# Altium footprint library Tomra_Cadstar_Footprints.PcbLib: 380 footprints (part 11 of 24)
Each footprint in its own frame and in the unit in brackets; x right, y up, seen from the top. Pads: shape width x height; smd on the part's side, far side on the other; paste and mask are expansions set on the pad; w line width, h text height; cw(c..) or ccw(c..) is an arc to the next point about the centre after c.
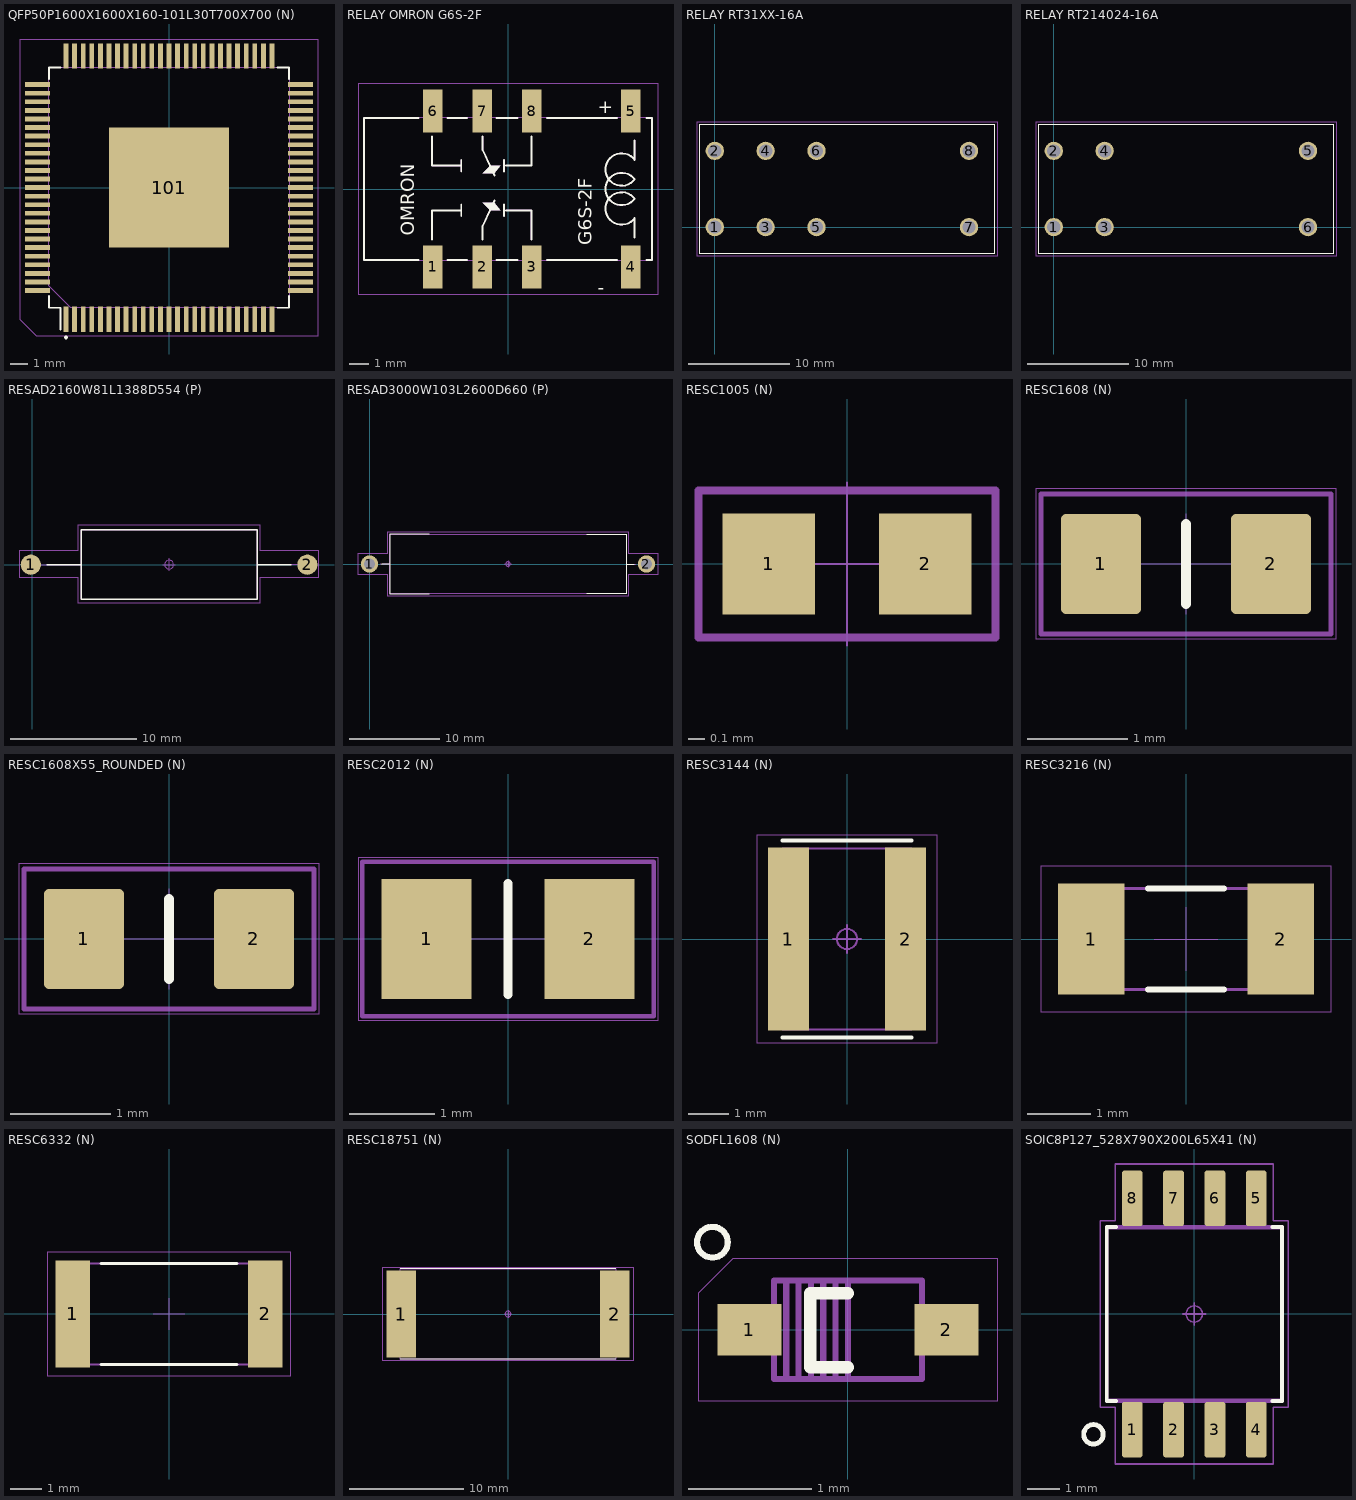
[diagram p10: the footprints below, top view; thin cyan lines are the x and y axes]

## QFP50P1600X1600X160-101L30T700X700 (N) [mm]
height 1.6
pads (101):
  rect 0.28x1.47 smd paste+0 mask+0: 1(-6,-7.67) 2(-5.5,-7.67) 3(-5,-7.67) 4(-4.5,-7.67) 5(-4,-7.67) 6(-3.5,-7.67) 7(-3,-7.67) 8(-2.5,-7.67) 9(-2,-7.67) 10(-1.5,-7.67) 11(-1,-7.67) 12(-0.5,-7.67) 13(0,-7.67) 14(0.5,-7.67) 15(1,-7.67) 16(1.5,-7.67) 17(2,-7.67) 18(2.5,-7.67) 19(3,-7.67) 20(3.5,-7.67) 21(4,-7.67) 22(4.5,-7.67) 23(5,-7.67) 24(5.5,-7.67) 25(6,-7.67) 51(6,7.67) 52(5.5,7.67) 53(5,7.67) 54(4.5,7.67) 55(4,7.67) 56(3.5,7.67) 57(3,7.67) 58(2.5,7.67) 59(2,7.67) 60(1.5,7.67) 61(1,7.67) 62(0.5,7.67) 63(0,7.67) 64(-0.5,7.67) 65(-1,7.67) 66(-1.5,7.67) 67(-2,7.67) 68(-2.5,7.67) 69(-3,7.67) 70(-3.5,7.67) 71(-4,7.67) 72(-4.5,7.67) 73(-5,7.67) 74(-5.5,7.67) 75(-6,7.67)
  rect 1.47x0.28 smd paste+0 mask+0: 26(7.67,-6) 27(7.67,-5.5) 28(7.67,-5) 29(7.67,-4.5) 30(7.67,-4) 31(7.67,-3.5) 32(7.67,-3) 33(7.67,-2.5) 34(7.67,-2) 35(7.67,-1.5) 36(7.67,-1) 37(7.67,-0.5) 38(7.67,0) 39(7.67,0.5) 40(7.67,1) 41(7.67,1.5) 42(7.67,2) 43(7.67,2.5) 44(7.67,3) 45(7.67,3.5) 46(7.67,4) 47(7.67,4.5) 48(7.67,5) 49(7.67,5.5) 50(7.67,6) 76(-7.67,6) 77(-7.67,5.5) 78(-7.67,5) 79(-7.67,4.5) 80(-7.67,4) 81(-7.67,3.5) 82(-7.67,3) 83(-7.67,2.5) 84(-7.67,2) 85(-7.67,1.5) 86(-7.67,1) 87(-7.67,0.5) 88(-7.67,0) 89(-7.67,-0.5) 90(-7.67,-1) 91(-7.67,-1.5) 92(-7.67,-2) 93(-7.67,-2.5) 94(-7.67,-3) 95(-7.67,-3.5) 96(-7.67,-4) 97(-7.67,-4.5) 98(-7.67,-5) 99(-7.67,-5.5) 100(-7.67,-6)
  rect 7x7 smd paste+0 mask+0: 101(0,0)
Top Silk:
  region: -6.1,-8.725 -6.1,-8.684 -6.041,-8.625 -5.959,-8.625 -5.9,-8.684 -5.9,-8.725 -5.9,-8.766 -5.959,-8.825 -6.041,-8.825 -6.1,-8.766
  lines w0.1: -7,-6.32 -7,-7 -6.32,-7 -6.32,-8.285 ; -7,6.32 -7,7 -6.32,7 ; 6.32,-7 7,-7 7,-6.32 ; 6.32,7 7,7 7,6.32
  text ".Designator" at -3.599,-0.35 h0.7
Top Paste:
  region: 3.155,-3.155 1.505,-3.155 1.505,-1.505 3.155,-1.505
  region: 3.155,-0.825 1.505,-0.825 1.505,0.825 3.155,0.825
  region: 3.155,1.505 1.505,1.505 1.505,3.155 3.155,3.155
  region: 0.825,-3.155 -0.825,-3.155 -0.825,-1.505 0.825,-1.505
  region: 0.825,-0.825 -0.825,-0.825 -0.825,0.825 0.825,0.825
  region: 0.825,1.505 -0.825,1.505 -0.825,3.155 0.825,3.155
  region: -1.505,-3.155 -3.155,-3.155 -3.155,-1.505 -1.505,-1.505
  region: -1.505,-0.825 -3.155,-0.825 -3.155,0.825 -1.505,0.825
  region: -1.505,1.505 -3.155,1.505 -3.155,3.155 -1.505,3.155
Top Assembly:
  lines w0.05: -7,-5.73 -5.73,-7 7,-7 7,7 -7,7 -7,-5.73
Top Placement:
  lines w0.01: -8.66,-7.7 -7.7,-8.66 8.66,-8.66 8.66,8.66 -8.66,8.66 -8.66,-7.7
  lines w0.05: -0.35,0 0.35,0 ; 0,-0.35 0,0.35 ; -0.25,0 cw(c0,0) 0.25,0 cw(c0,0) -0.25,0

## RELAY OMRON G6S-2F [mm]
height 7
pads (8):
  rect 1x2.2 smd paste+0 mask+0: 1(-3.86,-4) 2(-1.32,-4) 3(1.22,-4) 4(6.3,-4) 5(6.3,4) 6(-3.86,4) 7(-1.32,4) 8(1.22,4)
Top Silk:
  region: -0.4,-1.1 -0.9,-1.1 -1.3,-0.7 -0.7,-0.7
  region: -0.4,1.2 -0.9,1.2 -1.3,0.8 -0.7,0.8
  lines w0.1: -4.6,-3.65 -7.4,-3.65 -7.4,3.65 -4.6,3.65 ; -3.9,-2.6 -3.9,-1.1 -2.4,-1.1 ; -3.9,2.7 -3.9,1.2 -2.4,1.2 ; -3.1,-3.65 -2.1,-3.65 ; -3.1,3.65 -2.1,3.65 ; -2.4,-1.4 -2.4,-0.8 ; -2.4,0.9 -2.4,1.5 ; -1.3,-2.6 -1.3,-1.9 -0.7,-0.6 ; -1.3,2.7 -1.3,2 -0.7,0.7 ; -0.6,-3.65 0.5,-3.65 ; -0.6,3.65 0.5,3.65 ; -0.2,-1.4 -0.2,-0.8 ; -0.2,0.9 -0.2,1.5 ; -0.1,-1.1 1.2,-1.1 1.2,-2.6 ; -0.1,1.2 1.2,1.2 1.2,2.7 ; 2,-3.65 5.6,-3.65 ; 2,3.65 5.6,3.65 ; 6.5,-2.5 6.5,-1.5 cw(c5.833,-1) 6.5,-0.5 cw(c5.833,0) 6.5,0.5 cw(c5.833,1) 6.5,1.5 6.5,2.5 ; 7.1,-3.65 7.4,-3.65 7.4,3.65 7.1,3.65
  text "G6S-2F" at 4.3,-2.9 h0.7
  text "OMRON" at -4.8,-2.4 h0.7
  text "-" at 4.6,-5.4 h0.7
  text "+" at 4.6,3.9 h0.7
  text ".Designator" at -7.4,3.65 h0.7
Top Assembly:
  region: -0.4,-1.1 -0.9,-1.1 -1.3,-0.7 -0.7,-0.7
  region: -0.4,1.2 -0.9,1.2 -1.3,0.8 -0.7,0.8
  lines w0.05: -3.9,-2.6 -3.9,-1.1 -2.4,-1.1 ; -3.9,2.7 -3.9,1.2 -2.4,1.2 ; -2.4,-1.4 -2.4,-0.8 ; -2.4,0.9 -2.4,1.5 ; -1.3,-2.6 -1.3,-1.9 -0.7,-0.6 ; -1.3,2.7 -1.3,2 -0.7,0.7 ; -0.2,-1.4 -0.2,-0.8 ; -0.2,0.9 -0.2,1.5 ; -0.1,-1.1 1.2,-1.1 1.2,-2.6 ; -0.1,1.2 1.2,1.2 1.2,2.7 ; 6.5,-2.5 6.5,-1.5 cw(c5.833,-1) 6.5,-0.5 cw(c5.833,0) 6.5,0.5 cw(c5.833,1) 6.5,1.5 6.5,2.5 ; -7.4,-3.65 7.4,-3.65 7.4,3.65 -7.4,3.65 -7.4,-3.65
  text "-" at 4.6,-5.4 h0.7
  text "+" at 4.6,3.9 h0.7
Top Placement:
  lines w0.01: -7.7,-5.4 7.7,-5.4 7.7,5.4 -7.7,5.4 -7.7,-5.4

## RELAY RT31XX-16A [mm]
height 15.7
pads (8):
  round 1.8 / inner round 1.524 / far side round 1.8 hole 1.3 paste+0 mask+0: 1(0,0) 2(0,7.5) 3(5,0) 4(5,7.5) 5(10,0) 6(10,7.5) 7(25,0) 8(25,7.5)
Top Silk:
  lines w0.1: -1.5,-2.6 27.5,-2.6 27.5,10.1 -1.5,10.1 -1.5,-2.6
  text ".Designator" at -1.5,10.1 h0.7
Top Assembly:
  lines w0.05: -1.5,-2.6 27.5,-2.6 27.5,10.1 -1.5,10.1 -1.5,-2.6
Top Placement:
  lines w0.01: -1.75,-2.85 27.75,-2.85 27.75,10.35 -1.75,10.35 -1.75,-2.85

## RELAY RT214024-16A [mm]
height 16
pads (6):
  round 1.8 / inner round 1.524 / far side round 1.8 hole 1.3 paste+0 mask+0: 1(0,0) 2(0,7.5) 3(5,0) 4(5,7.5) 5(25,7.5) 6(25,0)
Top Silk:
  lines w0.1: -1.5,-2.6 27.5,-2.6 27.5,10.1 -1.5,10.1 -1.5,-2.6
  text ".Designator" at -1.5,10.1 h0.7
Top Assembly:
  lines w0.05: -1.5,-2.6 27.5,-2.6 27.5,10.1 -1.5,10.1 -1.5,-2.6
Top Placement:
  lines w0.01: -1.75,-2.85 27.75,-2.85 27.75,10.35 -1.75,10.35 -1.75,-2.85

## RESAD2160W81L1388D554 (P) [mm]
height 6.353
pads (2):
  round 1.6 smd paste-1.6 mask+0: 1(-0.122,0) 2(21.722,0)
Top Silk:
  lines w0.1: 1.15,0 3.85,0 ; 17.75,0 20.45,0 ; 3.85,-2.75 3.85,2.75 17.75,2.75 17.75,-2.75 3.85,-2.75
  text ".Designator" at 0,0 h0.7
Top Assembly:
  lines w0.05: 0,0 3.86,0 ; 17.74,0 21.6,0 ; 3.86,-2.77 3.86,2.77 17.74,2.77 17.74,-2.77 3.86,-2.77
Top Placement:
  lines w0.01: -1.06,-1 -1.06,1.1 3.6,1.1 3.6,3.1 17.98,3.1 17.98,1.1 22.64,1.1 22.64,-1 17.98,-1 17.98,-3 3.6,-3 3.6,-1 -1.06,-1
  lines w0.05: 10.3,0 11.3,0 ; 10.8,-0.5 10.8,0.5 ; 10.45,0 cw(c10.8,0) 11.15,0 cw(c10.8,0) 10.45,0

## RESAD3000W103L2600D660 (P) [mm]
height 8
pads (2):
  round 1.9 / inner round 1.524 / far side round 1.9 hole 1.25 paste+0 mask+0: 1(0,0) 2(30.48,0)
Top Silk:
  lines w0.1: 1.37,0 2.24,0 ; 6.57,-3.3 2.24,-3.3 2.24,3.3 6.57,3.3 ; 23.91,-3.3 28.24,-3.3 28.24,3.3 23.91,3.3 ; 28.24,0 29.11,0
  text ".Designator" at 2.24,3.3 h0.7
Top Assembly:
  lines w0.05: 1.19,0 2.24,0 ; 28.24,0 29.29,0 ; 2.24,-3.3 2.24,3.3 28.24,3.3 28.24,-3.3 2.24,-3.3
Top Placement:
  lines w0.01: -1.27,-1.2 -1.27,1.2 1.99,1.2 1.99,3.56 28.49,3.56 28.49,1.2 31.75,1.2 31.75,-1.2 28.49,-1.2 28.49,-3.56 1.99,-3.56 1.99,-1.2 -1.27,-1.2
  lines w0.05: 14.89,0 15.59,0 ; 15.24,-0.35 15.24,0.35 ; 14.99,0 cw(c15.24,0) 15.49,0 cw(c15.24,0) 14.99,0

## RESC1005 (N) [mm]
height 0.4
pads (2):
  rect 0.57x0.62 smd paste+0 mask+0: 1(-0.48,0) 2(0.48,0)
Top Silk:
  text ".Designator" at -3.599,-0.35 h0.7
Top Assembly:
  lines w0.05: -0.91,-0.45 0.91,-0.45 0.91,0.45 -0.91,0.45 -0.91,-0.45
Top Placement:
  lines w0.01: -0.5,0 0.5,0 ; 0,-0.5 0,0.5 ; -0.92,-0.46 0.92,-0.46 0.92,0.46 -0.92,0.46 -0.92,-0.46

## RESC1608 (N) [mm]
height 0.84
pads (2):
  rrect12% 0.8x1 smd paste+0 mask+0: 1(-0.85,0) 2(0.85,0)
Top Silk:
  lines w0.1: 0,-0.4 0,0.4
Top Assembly:
  lines w0.05: -1.45,-0.7 1.45,-0.7 1.45,0.7 -1.45,0.7 -1.45,-0.7
Top Placement:
  lines w0.01: -0.5,0 0.5,0 ; 0,-0.5 0,0.5 ; -1.5,-0.75 1.5,-0.75 1.5,0.75 -1.5,0.75 -1.5,-0.75

## RESC1608X55_ROUNDED (N) [mm]
height 0.55
pads (2):
  rrect12% 0.8x1 smd paste+0 mask+0: 1(-0.85,0) 2(0.85,0)
Top Silk:
  lines w0.1: 0,-0.4 0,0.4
Top Assembly:
  lines w0.05: -1.45,-0.7 1.45,-0.7 1.45,0.7 -1.45,0.7 -1.45,-0.7
Top Placement:
  lines w0.01: -0.5,0 0.5,0 ; 0,-0.5 0,0.5 ; -1.5,-0.75 1.5,-0.75 1.5,0.75 -1.5,0.75 -1.5,-0.75

## RESC2012 (N) [mm]
height 0.7
pads (2):
  rect 1.05x1.4 smd paste+0 mask+0: 1(-0.95,0) 2(0.95,0)
Top Silk:
  lines w0.1: 0,-0.65 0,0.65
  text ".Designator" at -3.599,-0.35 h0.7
Top Assembly:
  lines w0.05: -1.7,-0.9 1.7,-0.9 1.7,0.9 -1.7,0.9 -1.7,-0.9
Top Placement:
  lines w0.01: -0.5,0 0.5,0 ; 0,-0.5 0,0.5 ; -1.75,-0.95 1.75,-0.95 1.75,0.95 -1.75,0.95 -1.75,-0.95

## RESC3144 (N) [mm]
height 0.65
pads (2):
  rect 1.02x4.53 smd paste+0 mask+0: 1(-1.455,0) 2(1.455,0)
Top Silk:
  lines w0.1: -1.6,-2.445 1.6,-2.445 ; -1.6,2.445 1.6,2.445
  text ".Designator" at 0,0 h0.7
Top Assembly:
  lines w0.05: -1.6,-2.25 -1.6,2.25 1.6,2.25 1.6,-2.25 -1.6,-2.25
Top Placement:
  lines w0.01: -2.22,-2.58 -2.22,2.58 2.22,2.58 2.22,-2.58 -2.22,-2.58
  lines w0.05: -0.35,0 0.35,0 ; 0,-0.35 0,0.35 ; -0.25,0 cw(c0,0) 0.25,0 cw(c0,0) -0.25,0

## RESC3216 (N) [mm]
height 0.84
pads (2):
  rect 1.05x1.75 smd paste+0 mask+0: 1(-1.5,0) 2(1.5,0)
Top Silk:
  lines w0.1: -0.6,-0.8 0.6,-0.8 ; -0.6,0.8 0.6,0.8
  text ".Designator" at -3.599,-0.35 h0.7
Top Assembly:
  lines w0.05: -1.6,-0.8 1.6,-0.8 1.6,0.8 -1.6,0.8 -1.6,-0.8
Top Placement:
  lines w0.01: -0.5,0 0.5,0 ; 0,-0.5 0,0.5 ; -2.3,-1.15 2.3,-1.15 2.3,1.15 -2.3,1.15 -2.3,-1.15

## RESC6332 (N) [mm]
height 0.7
pads (2):
  rect 1.1x3.4 smd paste+0 mask+0: 1(-3.05,0) 2(3.05,0)
Top Silk:
  lines w0.1: -2.15,-1.6 2.15,-1.6 ; -2.15,1.6 2.15,1.6
  text ".Designator" at -3.599,-0.35 h0.7
Top Assembly:
  lines w0.05: -3.15,-1.6 3.15,-1.6 3.15,1.6 -3.15,1.6 -3.15,-1.6
Top Placement:
  lines w0.01: -0.5,0 0.5,0 ; 0,-0.5 0,0.5 ; -3.85,-1.95 3.85,-1.95 3.85,1.95 -3.85,1.95 -3.85,-1.95

## RESC18751 (N) [mm]
height 6.9
pads (2):
  rect 2.6x7.6 smd paste+0 mask+0: 1(-9.35,0) 2(9.35,0)
Top Silk:
  lines w0.1: -9.45,-3.98 9.45,-3.98 ; -9.45,3.98 9.45,3.98
  text ".Designator" at 0,0 h0.7
Top Assembly:
  lines w0.05: -9.45,-3.98 -9.45,3.98 9.45,3.98 9.45,-3.98 -9.45,-3.98
Top Placement:
  lines w0.01: -11,-4.11 -11,4.11 11,4.11 11,-4.11 -11,-4.11
  lines w0.05: -0.35,0 0.35,0 ; 0,-0.35 0,0.35 ; -0.25,0 cw(c0,0) 0.25,0 cw(c0,0) -0.25,0

## SODFL1608 (N) [mm]
pads (2):
  rect 0.52x0.42 smd paste+0 mask+0: 1(-0.8,0) 2(0.8,0)
Top Silk:
  lines w0.05: -1.225,0.71 cw(c-1.1,0.71) -0.975,0.71 cw(c-1.1,0.71) -1.225,0.71
  lines w0.1: 0,-0.305 -0.305,-0.305 -0.305,0.295 0,0.295
  text ".Designator" at 0,0 h0.7
Top Assembly:
  lines w0.05: -0.5,-0.4 -0.5,0.4 ; -0.4,-0.4 -0.4,0.4 ; -0.3,-0.4 -0.3,0.4 ; -0.2,-0.4 -0.2,0.4 ; -0.1,-0.4 -0.1,0.4 ; 0,-0.4 0,0.4 ; -0.6,-0.4 -0.6,0.4 0.6,0.4 0.6,-0.4 -0.6,-0.4
Top Placement:
  lines w0.01: -1.21,-0.58 -1.21,0.3 -0.93,0.58 1.21,0.58 1.21,-0.58 -1.21,-0.58

## SOIC8P127_528X790X200L65X41 (N) [mm]
height 2
pads (8):
  rrect25% 0.64x1.71 smd paste+0 mask+0: 1(-1.905,-3.555) 2(-0.635,-3.555) 3(0.635,-3.555) 4(1.905,-3.555) 5(1.905,3.555) 6(0.635,3.555) 7(-0.635,3.555) 8(-1.905,3.555)
Top Silk:
  lines w0.12: -2.405,-2.67 -2.69,-2.67 -2.69,2.67 -2.405,2.67 ; 2.405,-2.67 2.69,-2.67 2.69,2.67 2.405,2.67
  lines w0.15: -3.1,-4 cw(c-3.1,-3.7) -3.1,-3.4 cw(c-3.1,-3.7) -3.1,-4
  text ".Designator" at -4.319,-0.42 h0.84
Top Assembly:
  lines w0.12: -2.69,-2.67 -2.69,2.67 2.69,2.67 2.69,-2.67 -2.69,-2.67
Top Placement:
  lines w0.05: -0.35,0 0.35,0 ; 0,-0.35 0,0.35 ; -2.89,-2.87 -2.89,2.87 -2.425,2.87 -2.425,4.61 2.425,4.61 2.425,2.87 2.89,2.87 2.89,-2.87 2.425,-2.87 2.425,-4.61 -2.425,-4.61 -2.425,-2.87 -2.89,-2.87 ; -0.25,0 cw(c0,0) 0.25,0 cw(c0,0) -0.25,0
Top 3D Model Outline:
  lines w0.025: -2.64,-2.615 -2.64,2.615 2.64,2.615 2.64,-2.615 -2.64,-2.615 ; -2.113,-3.95 -1.697,-3.95 -1.697,-3.3 -2.113,-3.3 -2.113,-3.95 ; -2.113,3.3 -1.697,3.3 -1.697,3.95 -2.113,3.95 -2.113,3.3 ; -0.843,-3.95 -0.427,-3.95 -0.427,-3.3 -0.843,-3.3 -0.843,-3.95 ; -0.843,3.3 -0.427,3.3 -0.427,3.95 -0.843,3.95 -0.843,3.3 ; 0.427,-3.95 0.843,-3.95 0.843,-3.3 0.427,-3.3 0.427,-3.95 ; 0.427,3.3 0.843,3.3 0.843,3.95 0.427,3.95 0.427,3.3 ; 1.697,-3.95 2.113,-3.95 2.113,-3.3 1.697,-3.3 1.697,-3.95 ; 1.697,3.3 2.113,3.3 2.113,3.95 1.697,3.95 1.697,3.3